# Altium footprint library nPOC-BB_alpha_main-boardd.PcbLib: 42 footprints (part 1 of 3)
Each footprint in its own frame and in the unit in brackets; x right, y up, seen from the top. Pads: shape width x height; smd on the part's side, far side on the other; paste and mask are expansions set on the pad; w line width, h text height; cw(c..) or ccw(c..) is an arc to the next point about the centre after c.
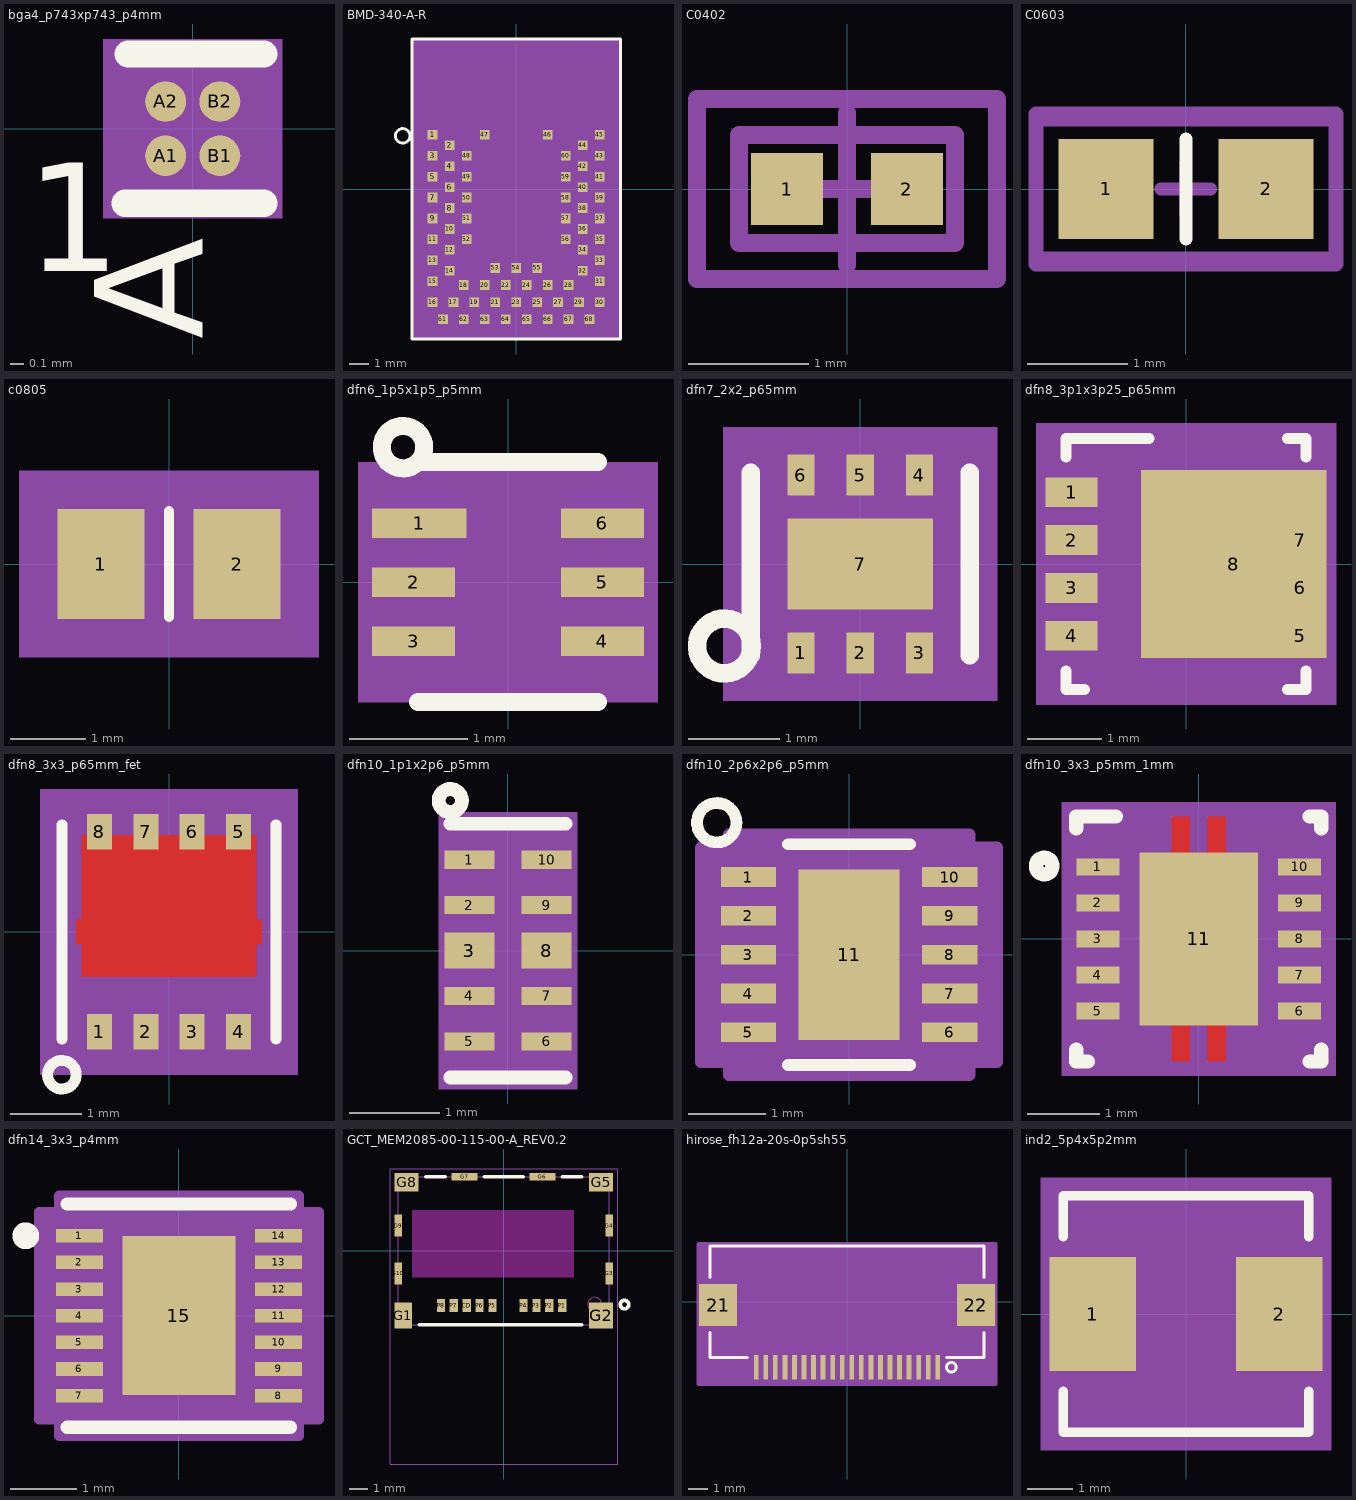
[diagram p0: the footprints below, top view; thin cyan lines are the x and y axes]

## bga4_p743xp743_p4mm [mm] "Flip Chip 4 pin"
height 0.61
pads (4):
  round 0.3 smd paste-0.05 mask-0.04: A1(-0.2,-0.2) A2(-0.2,0.2) B1(0.2,-0.2) B2(0.2,0.2)
Top Overlay:
  lines w0.2: -0.5,-0.55 0.525,-0.55 ; -0.475,0.55 0.525,0.55
  text "A" at 0.075,-1.55 h0.8
  text "1" at -1.225,-1.05 h0.8
Top Assembly:
  lines w0.025: -0.406,-0.206 -0.206,-0.406 ; -0.406,-0.406 -0.406,0.406 0.406,0.406 0.406,-0.406 -0.406,-0.406
  text "1" at -1.016,-0.889 h0.64
  text "2" at -1.143,0 h0.64
  text "A" at 0,-1.143 h0.64
  text "B" at 0.889,-1.143 h0.64
Top Courtyard:
  region: 0.66,-0.66 -0.66,-0.66 -0.66,0.66 0.66,0.66
3D body "BGA_20J25R_STM.step": height 0.61, standoff 0, extent -0.406,-0.406 0.406,0.406

## BMD-340-A-R [mil] "u-Blox, BMD-340-A-R, Stand-alone Bluetooth 5"
height 74.8
pads (68):
  rect 20x20 smd: 1(-173.23,112.2) 2(-137.8,90.55) 3(-173.23,68.9) 4(-137.8,47.24) 5(-173.23,25.59) 6(-137.8,3.94) 7(-173.23,-17.72) 8(-137.8,-39.37) 9(-173.23,-61.02) 10(-137.8,-82.68) 11(-173.23,-104.33) 12(-137.8,-125.98) 13(-173.23,-147.64) 14(-137.8,-169.29) 15(-173.23,-190.94) 16(-173.23,-234.25) 17(-129.92,-234.25) 18(-108.27,-198.82) 19(-86.61,-234.25) 20(-64.96,-198.82) 21(-43.31,-234.25) 22(-21.65,-198.82) 23(0,-234.25) 24(21.65,-198.82) 25(43.31,-234.25) 26(64.96,-198.82) 27(86.61,-234.25) 28(108.27,-198.82) 29(129.92,-234.25) 30(173.23,-234.25) 31(173.23,-190.94) 32(137.8,-169.29) 33(173.23,-147.64) 34(137.8,-125.98) 35(173.23,-104.33) 36(137.8,-82.68) 37(173.23,-61.02) 38(137.8,-39.37) 39(173.23,-17.72) 40(137.8,3.94) 41(173.23,25.59) 42(137.8,47.24) 43(173.23,68.9) 44(137.8,90.55) 45(173.23,112.2) 46(64.96,112.2) 47(-64.96,112.2) 48(-102.36,68.9) 49(-102.36,25.59) 50(-102.36,-17.72) 51(-102.36,-61.02) 52(-102.36,-104.33) 53(-43.31,-163.39) 54(0,-163.39) 55(43.31,-163.39) 56(102.36,-104.33) 57(102.36,-61.02) 58(102.36,-17.72) 59(102.36,25.59) 60(102.36,68.9) 61(-151.57,-269.69) 62(-108.27,-269.69) 63(-64.96,-269.69) 64(-21.65,-269.69) 65(21.65,-269.69) 66(64.96,-269.69) 67(108.27,-269.69) 68(151.57,-269.69)
Top Overlay:
  circle w6: c-235,110 r15
  lines w6: -216,-310.5 216,-310.5 216,310.5 -216,310.5 -216,-310.5
Top Assembly:
  circle w1: c-155,135 r25.5
  lines w1: -201,245.5 -151,295.5 ; -201,-295.5 201,-295.5 201,295.5 -201,295.5 -201,-295.5
Top Courtyard:
  region: -171.57,-305.5 -211,-305.5 -211,-193.23 -211,193.23 -211,305.5 -171.57,305.5 171.57,305.5 211,305.5 211,193.23 211,-193.23 211,-305.5 171.57,-305.5
  lines w6: -211,-305.5 -211,-193.23 -211,193.23 -211,305.5 -171.57,305.5 171.57,305.5 211,305.5 211,193.23 211,-193.23 211,-305.5 171.57,-305.5 -171.57,-305.5 -211,-305.5
3D body "BMD-340-A-R--3DModel-STEP-56544.STEP": height 74.8, standoff 0, extent -200.79,-295.28 200.79,295.28

## C0402 [mm] "C0402"
height 0.56
pads (2):
  rect 0.6x0.6 smd: 1(-0.5,0) 2(0.5,0)
Top Assembly:
  lines w0.15: -0.9,-0.45 0.9,-0.45 0.9,0.45 -0.9,0.45 -0.9,-0.45
Top Component Center:
  lines w0.15: -0.635,0 0.635,0 ; 0,-0.635 0,0.635
Top Courtyard:
  lines w0.15: -1.25,-0.75 1.25,-0.75 1.25,0.75 -1.25,0.75 -1.25,-0.75
3D body "0402.STEP": height 0.35, standoff 0, extent -0.5,-0.25 0.5,0.25

## C0603 [mm] "C0603"
height 0.9
pads (2):
  rect 0.95x1 smd: 1(-0.8,0) 2(0.8,0)
Top Overlay:
  lines w0.127: 0,-0.5 0,0.5
Top Assembly:
  lines w0.15: -1.5,-0.7 1.5,-0.7 1.5,0.7 -1.5,0.7 -1.5,-0.7
Top Component Center:
  lines w0.125: -0.25,0 0.25,0 ; 0,-0.25 0,0.25
Top Courtyard:
  lines w0.15: -1.5,-0.75 -1.5,0.75 1.5,0.75 1.5,-0.75 -1.5,-0.75
3D body "0603.STEP": height 0.45, standoff 0, extent -0.8,-0.4 0.8,0.4

## c0805 [mm] "0805"
pads (2):
  rect 1.15x1.45 smd: 1(-0.9,0) 2(0.9,0)
Top Overlay:
  lines w0.127: 0,-0.7 0,0.7
Top Assembly:
  lines w0.15: -1.75,0.95 -1.75,1 ; -1.75,1 1.75,1 1.75,-1 -1.75,-1 -1.75,1
Top Component Center:
  lines w0.15: -0.635,0 0.635,0 ; 0,-0.635 0,0.635
Top Courtyard:
  region: -0.22,-1.23 1.98,-1.23 1.98,1.23 -1.98,1.23 -1.98,-1.23
3D body "0805.STEP": height 0.4, standoff 0, extent -1,-0.6 1,0.6

## dfn6_1p5x1p5_p5mm [mm] "TI DSE0006A package- dfn 6 pin, 1.5x1.5mm, 0.5mm pitch, 0.8mm height"
height 0.8
pads (6):
  rect 0.8x0.25 smd: 1(-0.75,0.5)
  rect 0.7x0.25 smd: 2(-0.8,0) 3(-0.8,-0.5) 4(0.8,-0.5) 5(0.8,0) 6(0.8,0.5)
Top Overlay:
  circle w0.152: c-0.889,1.143 r0.18
  lines w0.15: -0.762,-1.016 0.762,-1.016 ; -0.762,1.016 0.762,1.016
Top Assembly:
  circle w0.025: c-0.45,0.45 r0.2
  lines w0.025: -0.775,-0.775 -0.775,0.775 0.775,0.775 0.775,-0.775 -0.775,-0.775
Top Courtyard:
  region: -1.27,1.016 1.27,1.016 1.27,-1.016 -1.27,-1.016
3D body "DSE0006A.stp": height 0.77, standoff -0.03, extent -0.75,-0.75 0.75,0.75

## dfn7_2x2_p65mm [mm] "TI - TPS61260DRVR"
height 0.8
pads (7):
  rect 0.3x0.45 smd: 1(-0.65,-0.975) 2(0,-0.975) 3(0.65,-0.975) 4(0.65,0.975) 5(0,0.975) 6(-0.65,0.975)
  rect 1.6x1 smd: 7(0,0)
Top Overlay:
  circle w0.203: c-1.49,-0.9 r0.3
  lines w0.2: -1.2,-1 -1.2,1 ; 1.2,-1 1.2,1
Top Assembly:
  circle w0.025: c-0.66,-0.66 r0.3
  lines w0.025: -1,-1 -1,1 1,1 1,-1 -1,-1
Top Courtyard:
  region: 1.5,-1.3 1.5,1.3 1.5,1.5 -1.5,1.5 -1.5,1.3 -1.5,-1.3 -1.5,-1.5 1.5,-1.5
3D body "TPS61260DRVT.STEP": height 0.8, standoff 0, extent -1,-1 1,1

## dfn8_3p1x3p25_p65mm [mm] "TI DNH0008A package, dfn 8 pin, 3.1 x 3.25mm. 0.65mm pitch, 0.9mm height"
height 0.9
pads (8):
  rect 0.7x0.4 smd: 1(-1.55,0.975) 2(-1.55,0.325) 3(-1.55,-0.325) 4(-1.55,-0.975) 5(1.55,-0.975) 6(1.55,-0.325) 7(1.55,0.325)
  rect 2.51x2.55 smd: 8(0.645,0)
Top Overlay:
  lines w0.15: -1.625,-1.453 -1.625,-1.7 -1.378,-1.7 ; -1.625,1.453 -1.625,1.7 -0.5,1.7 ; 1.378,-1.7 1.625,-1.7 1.625,-1.453 ; 1.378,1.7 1.625,1.7 1.625,1.453
Top Paste:
  region: 0.346,0.14 0.345,0.149 0.345,1.176 0.346,1.185 0.349,1.195 0.353,1.203 0.359,1.211 0.367,1.217 0.375,1.221 0.385,1.224 0.394,1.225 1.001,1.225 1.01,1.224 1.02,1.221 1.028,1.217 1.036,1.211 1.042,1.203 1.046,1.195 1.049,1.185 1.05,1.176 1.05,0.149 1.049,0.14 1.046,0.13 1.042,0.122 1.036,0.114 1.028,0.108 1.02,0.104 1.01,0.101 1.001,0.1 0.394,0.1 0.385,0.101 0.375,0.104 0.367,0.108 0.359,0.114 0.353,0.122 0.349,0.13
  region: 0.346,-1.185 0.345,-1.176 0.345,-0.149 0.346,-0.14 0.349,-0.13 0.353,-0.122 0.359,-0.114 0.367,-0.108 0.375,-0.104 0.385,-0.101 0.394,-0.1 1.001,-0.1 1.01,-0.101 1.02,-0.104 1.028,-0.108 1.036,-0.114 1.042,-0.122 1.046,-0.13 1.049,-0.14 1.05,-0.149 1.05,-1.176 1.049,-1.185 1.046,-1.195 1.042,-1.203 1.036,-1.211 1.028,-1.217 1.02,-1.221 1.01,-1.224 1.001,-1.225 0.394,-1.225 0.385,-1.224 0.375,-1.221 0.367,-1.217 0.359,-1.211 0.353,-1.203 0.349,-1.195
  region: 0.144,-0.14 0.145,-0.149 0.145,-1.176 0.144,-1.185 0.141,-1.195 0.137,-1.203 0.131,-1.211 0.123,-1.217 0.115,-1.221 0.105,-1.224 0.096,-1.225 -0.511,-1.225 -0.52,-1.224 -0.53,-1.221 -0.538,-1.217 -0.546,-1.211 -0.552,-1.203 -0.556,-1.195 -0.559,-1.185 -0.56,-1.176 -0.56,-0.149 -0.559,-0.14 -0.556,-0.13 -0.552,-0.122 -0.546,-0.114 -0.538,-0.108 -0.53,-0.104 -0.52,-0.101 -0.511,-0.1 0.096,-0.1 0.105,-0.101 0.115,-0.104 0.123,-0.108 0.131,-0.114 0.137,-0.122 0.141,-0.13
  region: 0.144,1.185 0.145,1.176 0.145,0.149 0.144,0.14 0.141,0.13 0.137,0.122 0.131,0.114 0.123,0.108 0.115,0.104 0.105,0.101 0.096,0.1 -0.511,0.1 -0.52,0.101 -0.53,0.104 -0.538,0.108 -0.546,0.114 -0.552,0.122 -0.556,0.13 -0.559,0.14 -0.56,0.149 -0.56,1.176 -0.559,1.185 -0.556,1.195 -0.552,1.203 -0.546,1.211 -0.538,1.217 -0.53,1.221 -0.52,1.224 -0.511,1.225 0.096,1.225 0.105,1.224 0.115,1.221 0.123,1.217 0.131,1.211 0.137,1.203 0.141,1.195
Top Solder:
  region: -0.559,-1.182 -0.56,-1.172 -0.56,1.172 -0.559,1.182 -0.556,1.192 -0.551,1.201 -0.544,1.209 -0.536,1.216 -0.527,1.221 -0.517,1.224 -0.507,1.225 1.162,1.225 1.172,1.224 1.182,1.221 1.191,1.216 1.199,1.209 1.206,1.201 1.211,1.192 1.214,1.182 1.215,1.172 1.215,-1.172 1.214,-1.182 1.211,-1.192 1.206,-1.201 1.199,-1.209 1.191,-1.216 1.182,-1.221 1.172,-1.224 1.162,-1.225 -0.507,-1.225 -0.517,-1.224 -0.527,-1.221 -0.536,-1.216 -0.544,-1.209 -0.551,-1.201 -0.556,-1.192
  region: 0.925,0.475 0.925,0.175 1.425,0.175 1.425,0.475
  region: 0.925,-0.175 0.925,-0.475 1.425,-0.475 1.425,-0.175
  region: 0.925,-0.825 0.925,-1.125 1.425,-1.125 1.425,-0.825
  region: 0.925,1.125 0.925,0.825 1.425,0.825 1.425,1.125
Top Assembly:
  circle w0.025: c-1.016,1.016 r0.254
  lines w0.025: -1.487,-1.119 -1.487,-1.569 -0.087,-1.569 ; -1.487,-0.819 -1.487,-0.469 ; -1.487,-0.169 -1.487,0.181 ; -1.487,0.481 -1.487,0.831 ; -1.487,1.131 -1.487,1.581 -0.087,1.581 ; 0.113,-1.569 1.513,-1.569 1.513,-1.119 ; 0.113,1.581 1.513,1.581 1.513,1.131 ; 1.513,-0.819 1.513,-0.469 ; 1.513,-0.169 1.513,0.181 ; 1.513,0.481 1.513,0.831 ; -1.637,-1.119 -1.461,-1.119 -1.461,-0.819 -1.637,-0.819 -1.637,-1.119 ; -1.637,-0.469 -1.461,-0.469 -1.461,-0.169 -1.637,-0.169 -1.637,-0.469 ; -1.637,0.181 -1.637,0.481 -1.461,0.481 -1.461,0.181 -1.637,0.181 ; -1.637,0.831 -1.461,0.831 -1.461,1.131 -1.637,1.131 -1.637,0.831 ; -0.087,-1.649 0.113,-1.649 0.113,-1.543 -0.087,-1.543 -0.087,-1.649 ; -0.087,1.554 0.113,1.554 0.113,1.661 -0.087,1.661 -0.087,1.554 ; 1.486,-1.119 1.663,-1.119 1.663,-0.819 1.486,-0.819 1.486,-1.119 ; 1.486,-0.469 1.663,-0.469 1.663,-0.169 1.486,-0.169 1.486,-0.469 ; 1.486,0.181 1.663,0.181 1.663,0.481 1.486,0.481 1.486,0.181 ; 1.486,0.831 1.663,0.831 1.663,1.131 1.486,1.131 1.486,0.831
Top Courtyard:
  region: -2.032,1.905 2.032,1.905 2.032,-1.905 -2.032,-1.905
3D body "DNH0008A.stp": height 0.9, standoff 0, extent -1.65,-1.655 1.65,1.655

## dfn8_3x3_p65mm_fet [mm] "Alpha & Omega DFN 3x3 EP"
height 0.8
pads (8):
  rect 0.35x0.5 smd: 1(-0.975,-1.4) 2(-0.325,-1.4) 3(0.325,-1.4) 4(0.975,-1.4) 5(0.975,1.4) 6(0.325,1.4) 7(-0.325,1.4) 8(-0.975,1.4)
Top Layer:
  region: -1.225,-0.625 -1.225,-0.175 -1.3,-0.175 -1.3,0.175 -1.225,0.175 -1.225,1.35 1.225,1.35 1.225,0.175 1.3,0.175 1.3,-0.175 1.225,-0.175 1.225,-0.625
Top Overlay:
  circle w0.152: c-1.5,-2 r0.2
  lines w0.152: -1.5,-1.5 -1.5,1.5 ; 1.5,-1.5 1.5,1.5
Top Paste:
  region: -1.225,-0.625 -1.225,-0.175 -1.3,-0.175 -1.3,0.175 -1.225,0.175 -1.225,1.35 1.225,1.35 1.225,0.175 1.3,0.175 1.3,-0.175 1.225,-0.175 1.225,-0.625
Top Solder:
  region: -1.275,-0.675 -1.275,-0.225 -1.35,-0.225 -1.35,0.225 -1.275,0.225 -1.275,1.4 1.275,1.4 1.275,0.225 1.35,0.225 1.35,-0.225 1.275,-0.225 1.275,-0.675
Top Assembly:
  circle w0.024: c-1,-1 r0.2
  lines w0.025: -1.5,-1.5 -1.5,1.5 -0.75,1.5 0.75,1.5 1.5,1.5 1.5,-1.5 -1.5,-1.5
Top Courtyard:
  region: -1.8,2 1.8,2 1.8,-2 -1.8,-2
3D body "AON7524.STEP": height 0.9, standoff 0, extent -1.55,-1.6 1.55,1.6

## dfn10_1p1x2p6_p5mm [mm] "TI DQA0010A package, dfn 10 pin, 1.1 x 2.6mm, 0.5mm pitch, 0.55mm  height"
height 0.55
pads (10):
  rect 0.55x0.2 smd: 1(-0.425,1) 2(-0.425,0.5) 4(-0.425,-0.5) 5(-0.425,-1) 6(0.425,-1) 7(0.425,-0.5) 9(0.425,0.5) 10(0.425,1)
  rect 0.55x0.4 smd: 3(-0.425,0) 8(0.425,0)
Top Overlay:
  circle w0.152: c-0.635,1.651 r0.127
  lines w0.15: -0.635,-1.397 0.635,-1.397 ; -0.635,1.397 0.635,1.397
Top Assembly:
  circle w0.025: c-0.2,0.9 r0.2
  lines w0.025: -0.55,-1.3 0.55,-1.3 0.55,1.3 -0.55,1.3 -0.55,-1.3
Top Courtyard:
  region: -0.762,1.524 0.762,1.524 0.762,-1.524 -0.762,-1.524
3D body "DQA0010A.stp": height 0.55, standoff 0, extent -0.5,-1.25 0.5,1.25

## dfn10_2p6x2p6_p5mm [mil] "DFN 10 pin, 2.6x2.6mm 0.5mm pitch"
height 19.68
pads (11):
  rect 28x10 smd: 1(-51,39.37) 2(-51,19.68) 3(-51,0) 4(-51,-19.68) 5(-51,-39.37) 6(51,-39.37) 7(51,-19.68) 8(51,0) 9(51,19.68) 10(51,39.37)
  rect 51.18x86.61 smd: 11(0,0)
Top Overlay:
  circle w5.91: c-67.11,66.93 r10
  lines w6: -30.97,-56 30.97,-56 ; -30.97,56 30.97,56
Top Assembly:
  circle w1: c-35,35 r10
  lines w1: -51,-51 -51,51 51,51 51,-51 -51,-51
Top Courtyard:
  region: -5.16,-61 -61,-61 -61,-54.37 -75,-54.37 -75,54.37 -61,54.37 -61,61 -5.16,61 5.16,61 61,61 61,54.37 75,54.37 75,-54.37 61,-54.37 61,-61 5.16,-61
  lines w6: -75,-54.37 -61,-54.37 -61,-61 -5.16,-61 5.16,-61 61,-61 61,-54.37 75,-54.37 75,54.37 61,54.37 61,61 5.16,61 -5.16,61 -61,61 -61,54.37 -75,54.37 -75,-54.37
3D body "DFN10_2P7X2P7_NXP.step": height 39.09, standoff 0, extent -52.99,-50.98 52.99,50.98

## dfn10_3x3_p5mm_1mm [mm] "DFN 10 pin, 3x3, 0.5mm pitch, 1mm height, DRC0010J"
height 1
pads (11):
  rect 0.6x0.24 smd paste+0 mask+0.051: 1(-1.4,1) 2(-1.4,0.5) 3(-1.4,0) 4(-1.4,-0.5) 5(-1.4,-1) 6(1.4,-1) 7(1.4,-0.5) 8(1.4,0) 9(1.4,0.5) 10(1.4,1)
  rect 1.65x2.4 smd paste-1.187 mask+0.051: 11(0,0)
Top Layer:
  region: -0.125,1.2 -0.125,1.7 -0.375,1.7 -0.375,-1.7 -0.125,-1.7 -0.125,-1.2 0.125,-1.2 0.125,-1.7 0.375,-1.7 0.375,1.7 0.125,1.7 0.125,1.2
Top Overlay:
  circle w0.2: c-2.146,1.013 r0.114
  lines w0.2: -1.7,-1.54 -1.7,-1.7 -1.54,-1.7 ; -1.7,1.54 -1.7,1.7 -1.15,1.7 ; 1.54,-1.7 1.7,-1.7 1.7,-1.54 ; 1.54,1.7 1.7,1.7 1.7,1.54
Top Paste:
  region: -0.75,1.16 -0.75,0.1 0.75,0.1 0.75,1.16
  region: -0.75,-0.1 -0.75,-1.16 0.75,-1.16 0.75,-0.1
  region: -0.375,1.35 -0.375,1.7 -0.125,1.7 -0.125,1.35
  region: 0.125,1.35 0.125,1.7 0.375,1.7 0.375,1.35
  region: -0.375,-1.7 -0.375,-1.35 -0.125,-1.35 -0.125,-1.7
  region: 0.125,-1.7 0.125,-1.35 0.375,-1.35 0.375,-1.7
Top Solder:
  region: -0.425,1.2 -0.425,1.75 -0.075,1.75 -0.075,1.2 0.075,1.2 0.075,1.75 0.425,1.75 0.425,1.2
  region: 0.425,-1.2 0.425,-1.75 0.075,-1.75 0.075,-1.2 -0.075,-1.2 -0.075,-1.75 -0.425,-1.75 -0.425,-1.2
Top Assembly:
  circle w0.025: c-0.875,0.875 r0.3
  lines w0.025: -1.55,-1.55 1.55,-1.55 1.55,1.55 -1.55,1.55 -1.55,-1.55
Top Courtyard:
  rectangle: -1.905,-1.905 1.905,1.905
3D body "DRC0010J.stp": height 1, standoff 0, extent -1.5,-1.5 1.5,1.5

## dfn14_3x3_p4mm [mm] "DFN 14 pin, 3x3mm, 0.4mm pin pitch, 0.75mm height"
height 0.8
pads (15):
  rect 0.706x0.204 smd: 1(-1.496,1.2) 2(-1.496,0.8) 3(-1.496,0.4) 4(-1.496,0) 5(-1.496,-0.4) 6(-1.496,-0.8) 7(-1.496,-1.2) 8(1.496,-1.2) 9(1.496,-0.8) 10(1.496,-0.4) 11(1.496,0) 12(1.496,0.4) 13(1.496,0.8) 14(1.496,1.2)
  rect 1.702x2.388 smd: 15(0,0)
Top Overlay:
  circle w0.2: c-2.3,1.2 r0.102
  lines w0.2: -1.676,-1.676 1.676,-1.676 ; -1.676,1.676 1.676,1.676
Top Assembly:
  circle w0.025: c-1.143,1.2 r0.076
  lines w0.025: -0.305,1.549 ccw(c0,1.549) 0.305,1.549 ; -1.549,-1.549 -1.549,1.549 1.549,1.549 1.549,-1.549 -1.549,-1.549
Top Courtyard:
  region: -1.803,-1.556 -2.103,-1.556 -2.103,1.556 -1.803,1.556 -1.803,1.803 1.803,1.803 1.803,1.556 2.103,1.556 2.103,-1.556 1.803,-1.556 1.803,-1.803 -1.803,-1.803
  lines w0.152: -2.103,-1.556 -1.803,-1.556 -1.803,-1.803 1.803,-1.803 1.803,-1.556 2.103,-1.556 2.103,1.556 1.803,1.556 1.803,1.803 -1.803,1.803 -1.803,1.556 -2.103,1.556 -2.103,-1.556
3D body "21-0137I_T1433-2_MXM.step": height 0.81, standoff 0, extent -1.549,-1.549 1.549,1.549

## GCT_MEM2085-00-115-00-A_REV0.2 [mm] "GCT Micro CD Memory Card Connector, Push-Pull, 1.15mm profile"
height 1.15
pads (19):
  rect 0.45x0.7 smd: CD(-2.02,-2.99) P1(3.18,-2.99) P2(2.48,-2.99) P3(1.78,-2.99) P4(1.08,-2.99) P5(-0.62,-2.99) P6(-1.32,-2.99) P7(-2.72,-2.99) P8(-3.42,-2.99)
  rect 0.95x1.4 smd: G1(-5.475,-3.53)
  rect 1.3x1.4 smd: G2(5.3,-3.53)
  rect 0.4x1.2 smd: G3(5.75,-1.23) G4(5.75,1.37) G9(-5.75,1.37) G10(-5.75,-1.23)
  rect 1.3x1 smd: G5(5.3,3.73) G8(-5.3,3.73)
  rect 1.4x0.4 smd: G6(2.11,4.03) G7(-2.14,4.03)
Top Layer keep-out:
  region: 3.8,-1.44 -5,-1.44 -5,2.2 3.8,2.2
Top Overlay:
  circle w0.2: c6.58,-2.93 r0.23
  lines w0.2: -4.6,-4.03 4.25,-4.03 ; -4.25,4.03 -3.2,4.03 ; -1.05,4.03 1.05,4.03 ; 3.2,4.03 4.25,4.03
Top Assembly:
  circle w0.025: c4.953,-2.921 r0.381
  lines w0.025: -5.76,-4.03 -5.76,4.03 5.76,4.03 5.76,-4.03 -5.76,-4.03
Top Courtyard:
  lines w0.05: -6.2,-11.62 6.2,-11.62 6.2,4.48 -6.2,4.48 -6.2,-11.62
3D body "MEM2085-00-115-00-A.stp": height 1.14, standoff -0.04, extent -5.815,-4.064 5.815,4.094

## hirose_fh12a-20s-0p5sh55 [mm] "Hirose FH12A Series 0.5mm pitch top contact FPC/FFC"
height 3.6
pads (22):
  rect 0.25x1.3 smd: 1(4.75,-3.429) 2(4.25,-3.429) 3(3.75,-3.429) 4(3.25,-3.429) 5(2.75,-3.429) 6(2.25,-3.429) 7(1.75,-3.429) 8(1.25,-3.429) 9(0.75,-3.429) 10(0.25,-3.429) 11(-0.25,-3.429) 12(-0.75,-3.429) 13(-1.25,-3.429) 14(-1.75,-3.429) 15(-2.25,-3.429) 16(-2.75,-3.429) 17(-3.25,-3.429) 18(-3.75,-3.429) 19(-4.25,-3.429) 20(-4.75,-3.429)
  rect 2x2.2 smd: 21(-6.75,-0.178) 22(6.75,-0.178)
Top Overlay:
  circle w0.152: c5.461,-3.429 r0.254
  lines w0.152: -7.175,-1.615 -7.175,-2.921 -5.21,-2.921 ; -7.175,1.26 -7.175,2.921 7.175,2.921 7.175,1.26 ; 5.21,-2.921 7.175,-2.921 7.175,-1.615
Top Assembly:
  lines w0.025: 4.115,-2.794 4.75,-4.064 5.385,-2.794 ; -7.048,-2.794 7.048,-2.794 7.048,2.794 -7.048,2.794 -7.048,-2.794
Top Courtyard:
  region: -7.798,-4.331 7.798,-4.331 7.798,-3.048 7.798,3.048 -7.798,3.048 -7.798,-3.048
  lines w0.152: -7.798,-4.331 7.798,-4.331 7.798,-3.048 7.798,3.048 -7.798,3.048 -7.798,-3.048 -7.798,-4.331
3D body "FH12A-20S-0.5SH.stp": height 2.05, standoff -0.1, extent -7.25,-3.81 7.25,3.19

## ind2_5p4x5p2mm [mm] "Sumida 0530CDMCC/DS"
height 3
pads (2):
  rect 1.9x2.5 smd: 1(-2.05,0) 2(2.05,0)
Top Overlay:
  lines w0.203: -2.7,-1.7 -2.7,-2.6 2.7,-2.6 2.7,-1.7 ; -2.7,1.7 -2.7,2.6 2.7,2.6 2.7,1.7
Top Assembly:
  lines w0.025: -2.7,-2.6 2.7,-2.6 2.7,2.6 -2.7,2.6 -2.7,-2.6
Top Courtyard:
  region: -3.2,3 3.2,3 3.2,-3 -3.2,-3
3D body: height 3, standoff 0, extent -2.7,-2.6 2.7,2.6